# Altium footprint library 常用元件封装库.PcbLib: 1310 footprints (part 53 of 83)
Each footprint in its own frame and in the unit in brackets; x right, y up, seen from the top. Pads: shape width x height; smd on the part's side, far side on the other; paste and mask are expansions set on the pad; w line width, h text height; cw(c..) or ccw(c..) is an arc to the next point about the centre after c.
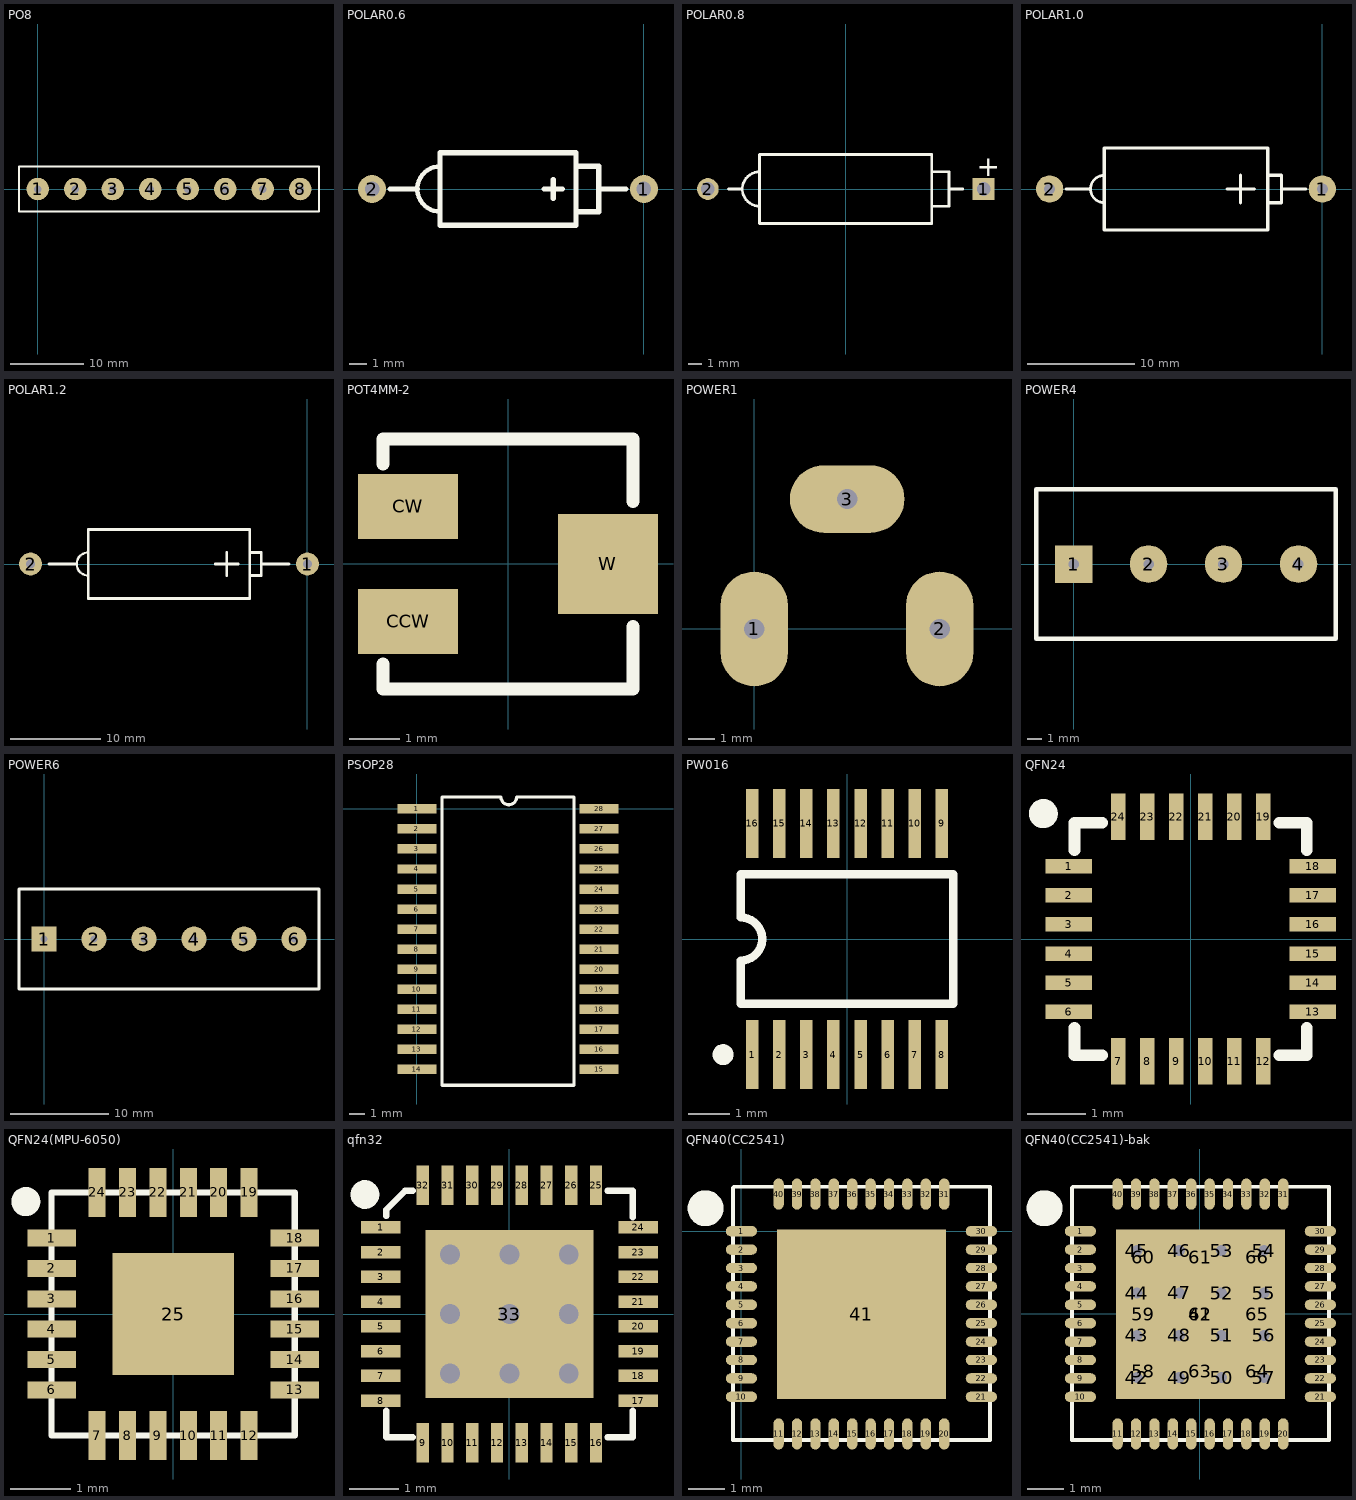
[diagram p52: the footprints below, top view; thin cyan lines are the x and y axes]

## PO8 [mil]
pads (8):
  round 120 hole 40: 1(0,0) 2(200,0) 3(400,0) 4(600,0) 5(800,0) 6(1000,0) 7(1200,0) 8(1400,0)
Top Overlay:
  lines w10: -100,-120 1500,-120 1500,120 -100,120 -100,0 -100,-120

## POLAR0.6 [mil]
pads (2):
  round 62 hole 32: 1(0,0) 2(-600,0)
Top Overlay:
  lines w10: -450,-50 cw(c-450,0) -450,50
  lines w12: -560,0 -500,0 ; -220,0 -180,0 ; -200,-20 -200,20 ; -150,-50 -100,-50 -100,50 -150,50 ; -100,0 -40,0 ; -450,-80 -150,-80 -150,80 -450,80 -450,-80

## POLAR0.8 [mm] "Polarized Capacitor (Axial); 2 Leads"
height 5.08
pads (2):
  rect 1.6x1.6 hole 1: 1(10.16,0)
  round 1.6 hole 1: 2(-10.16,0)
Top Overlay:
  lines w0.2: -8.636,0 -7.62,0 ; -6.35,-1.27 cw(c-6.35,0) -6.35,1.27 ; 6.35,-1.27 7.62,-1.27 7.62,1.27 6.35,1.27 ; 7.62,0 8.636,0 ; -6.35,-2.54 -6.35,2.54 6.35,2.54 6.35,-2.54 -6.35,-2.54
  text "+" at 9.652,0.95 h1.5

## POLAR1.0 [mil]
pads (2):
  round 100 hole 40: 1(0,0) 2(-1000,0)
Top Overlay:
  lines w10: -800,-50 cw(c-800,0) -800,50
  lines w12: -940,0 -850,0 ; -350,0 -250,0 ; -300,-50 -300,50 ; -200,-50 -150,-50 -150,50 -200,50 ; -150,0 -60,0 ; -800,-150 -200,-150 -200,150 -800,150 -800,-150

## POLAR1.2 [mil]
pads (2):
  round 100 hole 40: 1(0,0) 2(-1200,0)
Top Overlay:
  lines w10: -950,-50 cw(c-950,0) -950,50
  lines w12: -1120,0 -1000,0 ; -400,0 -300,0 ; -350,-50 -350,50 ; -250,-50 -200,-50 -200,50 -250,50 ; -200,0 -80,0 ; -950,-150 -250,-150 -250,150 -950,150 -950,-150

## POT4MM-2 [mm] "Square Trimming Potentiometer"
pads (3):
  rect 2x1.3 smd: CCW(-2,-1.15) CW(-2,1.15)
  rect 2x2 smd: W(2,0)
Top Overlay:
  lines w0.254: -2.5,-2 -2.5,-2.5 2.5,-2.5 2.5,-1.25 ; -2.5,2 -2.5,2.5 2.5,2.5 2.5,1.25

## POWER1 [mil]
pads (3):
  oval 100x170 hole 30: 1(0,0) 2(275,0)
  oval 170x100 hole 30: 3(137.8,192.68)

## POWER4 [mil]
pads (4):
  rect 100x100 hole 28: 1(0,0)
  round 100 hole 28: 2(200,0) 3(400,0) 4(600,0)
Top Overlay:
  lines w12: -100,-200 700,-200 700,200 -100,200 -100,-200

## POWER6 [mil]
pads (6):
  rect 100x100 hole 28: 1(0,0)
  round 100 hole 28: 2(200,0) 3(400,0) 4(600,0) 5(800,0) 6(1000,0)
Top Overlay:
  lines w12: -100,-200 1100,-200 1100,200 -100,200 -100,-200

## PSOP28 [mm]
pads (28):
  rect 2.5x0.6 smd: 1(0.013,0) 2(0.013,-1.27) 3(0.013,-2.54) 4(0.013,-3.81) 5(0.013,-5.08) 6(0.013,-6.35) 7(0.013,-7.62) 8(0.013,-8.89) 9(0.013,-10.16) 10(0.013,-11.43) 11(0.013,-12.7) 12(0.013,-13.97) 13(0.013,-15.24) 14(0.013,-16.51) 15(11.557,-16.51) 16(11.557,-15.24) 17(11.557,-13.97) 18(11.557,-12.7) 19(11.557,-11.43) 20(11.557,-10.16) 21(11.557,-8.89) 22(11.557,-7.62) 23(11.557,-6.35) 24(11.557,-5.08) 25(11.557,-3.81) 26(11.557,-2.54) 27(11.557,-1.27) 28(11.557,0)
Top Overlay:
  lines w0.2: 6.334,0.762 cw(c5.834,0.762) 5.334,0.762 1.594,0.762 1.594,-17.526 9.962,-17.526 9.962,0.762 6.35,0.762

## PW016 [mm] "Shrink Small Outline; 16 Leads; Body Width 4.4 mm; Pitch 0.65 mm"
height 1.2
pads (16):
  rect 0.3x1.65 smd: 1(-2.275,-2.775) 2(-1.625,-2.775) 3(-0.975,-2.775) 4(-0.325,-2.775) 5(0.325,-2.775) 6(0.975,-2.775) 7(1.625,-2.775) 8(2.275,-2.775) 9(2.275,2.775) 10(1.625,2.775) 11(0.975,2.775) 12(0.325,2.775) 13(-0.325,2.775) 14(-0.975,2.775) 15(-1.625,2.775) 16(-2.275,2.775)
Top Overlay:
  circle w0.25: c-2.975,-2.775 r0.125
  lines w0.2: -2.55,-1.55 -2.55,-0.517 ccw(c-2.55,0) -2.55,0.517 -2.55,1.55 2.55,1.55 2.55,-1.55 -2.55,-1.55

## QFN24 [mm]
pads (24):
  rect 0.8x0.25 smd: 1(-2.101,1.25) 2(-2.101,0.75) 3(-2.101,0.25) 4(-2.101,-0.25) 5(-2.101,-0.75) 6(-2.101,-1.25) 13(2.101,-1.25) 14(2.101,-0.75) 15(2.101,-0.25) 16(2.101,0.25) 17(2.101,0.75) 18(2.101,1.25)
  rect 0.25x0.8 smd: 7(-1.25,-2.101) 8(-0.75,-2.101) 9(-0.25,-2.101) 10(0.25,-2.101) 11(0.75,-2.101) 12(1.25,-2.101) 19(1.25,2.101) 20(0.75,2.101) 21(0.25,2.101) 22(-0.25,2.101) 23(-0.75,2.101) 24(-1.25,2.101)
Top Overlay:
  circle w0.25: c-2.538,2.159 r0.125
  lines w0.2: -2,-1.525 -2,-2 -1.525,-2 ; -2,1.525 -2,2 -1.525,2 ; 1.525,-2 2,-2 2,-1.525 ; 1.525,2 2,2 2,1.525

## QFN24(MPU-6050) [mm]
pads (25):
  rect 0.8x0.28 smd: 1(-2,1.25) 2(-2,0.75) 3(-2,0.25) 4(-2,-0.25) 5(-2,-0.75) 6(-2,-1.25) 13(2,-1.25) 14(2,-0.75) 15(2,-0.25) 16(2,0.25) 17(2,0.75) 18(2,1.25)
  rect 0.28x0.8 smd: 7(-1.25,-2) 8(-0.75,-2) 9(-0.25,-2) 10(0.25,-2) 11(0.75,-2) 12(1.25,-2) 19(1.25,2) 20(0.75,2) 21(0.25,2) 22(-0.25,2) 23(-0.75,2) 24(-1.25,2)
  rect 2x2 smd: 25(0,0)
Top Overlay:
  circle w0.254: c-2.425,1.85 r0.112
  lines w0.102: -2,-2 2,-2 2,2 -2,2 -2,-2

## qfn32 [mm]
pads (33):
  rect 0.8x0.25 smd: 1(-2.601,1.75) 2(-2.601,1.25) 3(-2.601,0.75) 4(-2.601,0.25) 5(-2.601,-0.25) 6(-2.601,-0.75) 7(-2.601,-1.25) 8(-2.601,-1.75) 17(2.601,-1.75) 18(2.601,-1.25) 19(2.601,-0.75) 20(2.601,-0.25) 21(2.601,0.25) 22(2.601,0.75) 23(2.601,1.25) 24(2.601,1.75)
  rect 0.25x0.8 smd: 9(-1.75,-2.601) 10(-1.25,-2.601) 11(-0.75,-2.601) 12(-0.25,-2.601) 13(0.25,-2.601) 14(0.75,-2.601) 15(1.25,-2.601) 16(1.75,-2.601) 25(1.75,2.601) 26(1.25,2.601) 27(0.75,2.601) 28(0.25,2.601) 29(-0.25,2.601) 30(-0.75,2.601) 31(-1.25,2.601) 32(-1.75,2.601)
  rect 3.4x3.4 smd: 33(0,0)
via 1.2,-1.2 diameter 0.7 hole 0.4
via 0,-1.2 diameter 0.7 hole 0.4
via -1.2,-1.2 diameter 0.7 hole 0.4
via 1.2,0 diameter 0.7 hole 0.4
via 0,0 diameter 0.7 hole 0.4
via -1.2,0 diameter 0.7 hole 0.4
via 1.2,1.2 diameter 0.7 hole 0.4
via 0,1.2 diameter 0.7 hole 0.4
via -1.2,1.2 diameter 0.7 hole 0.4
Top Overlay:
  circle w0.3: c-2.919,2.413 r0.14
  lines w0.127: -2.489,-1.956 -2.489,-2.489 -1.956,-2.489 ; -2.489,1.981 -2.489,2.108 -2.108,2.489 -1.956,2.489 ; 1.981,-2.489 2.489,-2.489 2.489,-1.956 ; 1.981,2.489 2.489,2.489 2.489,1.956
Mechanical 15:
  lines w0.1: -0.5,0 0.5,0 ; 0,-0.5 0,0.5

## QFN40(CC2541) [mm]
pads (41):
  oval 0.85x0.28 smd: 1(0,0) 2(0,-0.5) 3(0,-1) 4(0,-1.5) 5(0,-2) 6(0,-2.5) 7(0,-3) 8(0,-3.5) 9(0,-4) 10(0,-4.5) 21(6.52,-4.5) 22(6.52,-4) 23(6.52,-3.5) 24(6.52,-3) 25(6.52,-2.5) 26(6.52,-2) 27(6.52,-1.5) 28(6.52,-1) 29(6.52,-0.5) 30(6.52,0)
  oval 0.28x0.85 smd: 11(1.01,-5.51) 12(1.51,-5.51) 13(2.01,-5.51) 14(2.51,-5.51) 15(3.01,-5.51) 16(3.51,-5.51) 17(4.01,-5.51) 18(4.51,-5.51) 19(5.01,-5.51) 20(5.51,-5.51) 31(5.51,1.01) 32(5.01,1.01) 33(4.51,1.01) 34(4.01,1.01) 35(3.51,1.01) 36(3.01,1.01) 37(2.51,1.01) 38(2.01,1.01) 39(1.51,1.01) 40(1.01,1.01)
  rect 4.6x4.6 smd: 41(3.26,-2.255)
Top Overlay:
  circle w0.508: c-0.974,0.623 r0.234
  lines w0.102: -0.231,1.182 -0.231,-5.676 6.754,-5.676 6.754,1.208 -0.206,1.208

## QFN40(CC2541)-bak [mm]
pads (66):
  oval 0.85x0.28 smd: 1(-3.248,2.247) 2(-3.248,1.747) 3(-3.248,1.247) 4(-3.248,0.747) 5(-3.248,0.247) 6(-3.248,-0.253) 7(-3.248,-0.753) 8(-3.248,-1.253) 9(-3.248,-1.753) 10(-3.248,-2.253) 21(3.272,-2.253) 22(3.272,-1.753) 23(3.272,-1.253) 24(3.272,-0.753) 25(3.272,-0.253) 26(3.272,0.247) 27(3.272,0.747) 28(3.272,1.247) 29(3.272,1.747) 30(3.272,2.247)
  oval 0.28x0.85 smd: 11(-2.238,-3.263) 12(-1.738,-3.263) 13(-1.238,-3.263) 14(-0.738,-3.263) 15(-0.238,-3.263) 16(0.262,-3.263) 17(0.762,-3.263) 18(1.262,-3.263) 19(1.762,-3.263) 20(2.262,-3.263) 31(2.262,3.257) 32(1.762,3.257) 33(1.262,3.257) 34(0.762,3.257) 35(0.262,3.257) 36(-0.238,3.257) 37(-0.738,3.257) 38(-1.238,3.257) 39(-1.738,3.257) 40(-2.238,3.257)
  rect 4.6x4.6 smd: 41(0.012,-0.008)
  round 0.8 hole 0.3: 42(-1.713,-1.733) 43(-1.713,-0.583) 44(-1.713,0.567) 45(-1.713,1.717) 46(-0.563,1.717) 47(-0.558,0.572) 48(-0.563,-0.583) 49(-0.563,-1.733) 50(0.587,-1.733) 51(0.587,-0.583) 52(0.587,0.567) 53(0.587,1.717) 54(1.737,1.717) 55(1.737,0.567) 56(1.737,-0.583) 57(1.737,-1.733)
  rect 1.1x1.1 smd: 58(-1.538,-1.558) 59(-1.538,-0.008) 60(-1.538,1.542) 61(0.012,1.542) 62(0.012,-0.008) 63(0.012,-1.558) 64(1.562,-1.558) 65(1.562,-0.008) 66(1.562,1.542)
Top Overlay:
  circle w0.508: c-4.222,2.87 r0.234
  lines w0.102: -3.48,3.429 -3.48,-3.429 3.505,-3.429 3.505,3.454 -3.454,3.454